# Altium footprint library OSHW_LuxonisMaster_20201223.PcbLib: 112 footprints (part 2 of 7)
Each footprint in its own frame and in the unit in brackets; x right, y up, seen from the top. Pads: shape width x height; smd on the part's side, far side on the other; paste and mask are expansions set on the pad; w line width, h text height; cw(c..) or ccw(c..) is an arc to the next point about the centre after c.
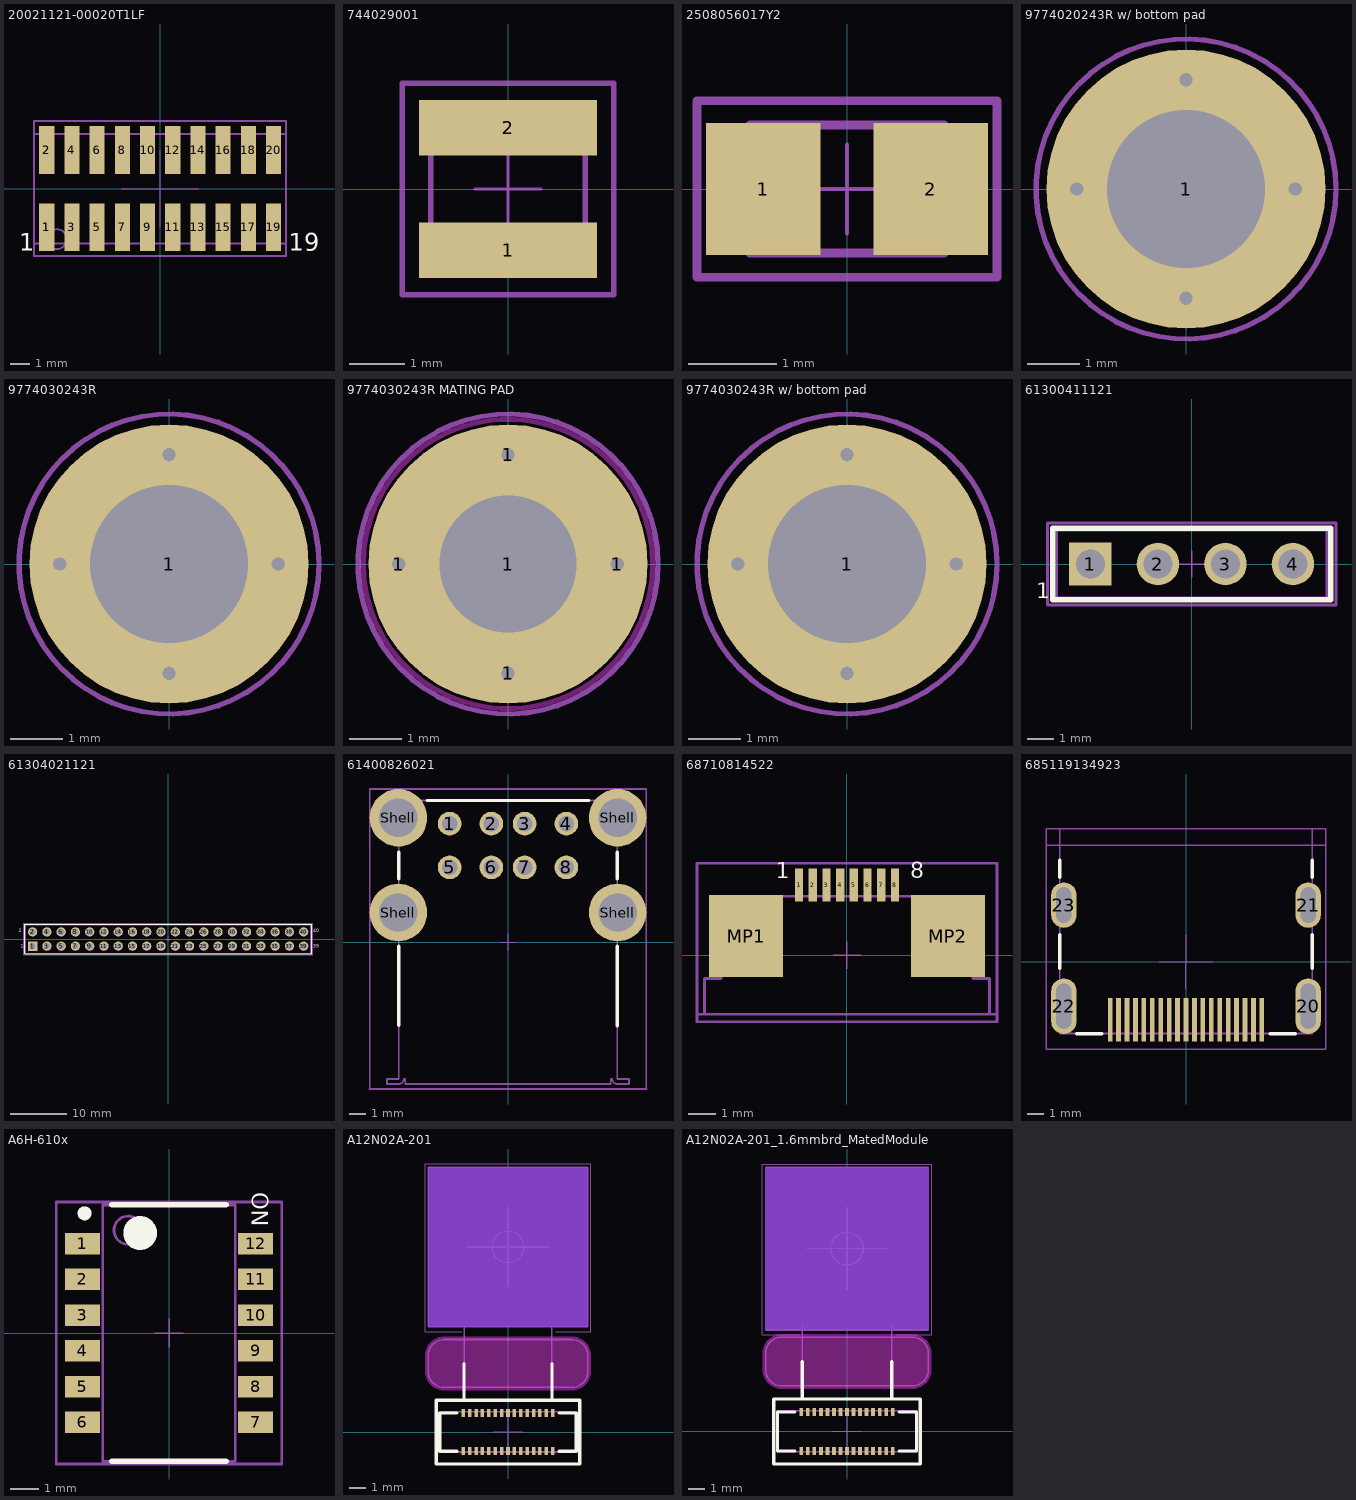
[diagram p1: the footprints below, top view; thin cyan lines are the x and y axes]

## 20021121-00020T1LF [mm] "20pin SMT Minitek127 1.27mm pitch"
pads (22):
  rect 0.76x2.4 smd: 1(-5.715,-1.95) 1(-5.715,-1.95) 2(-5.715,1.95) 2(-5.715,1.95) 3(-4.445,-1.95) 4(-4.445,1.95) 5(-3.175,-1.95) 6(-3.175,1.95) 7(-1.905,-1.95) 8(-1.905,1.95) 9(-0.635,-1.95) 10(-0.635,1.95) 11(0.635,-1.95) 12(0.635,1.95) 13(1.905,-1.95) 14(1.905,1.95) 15(3.175,-1.95) 16(3.175,1.95) 17(4.445,-1.95) 18(4.445,1.95) 19(5.715,-1.95) 20(5.715,1.95)
Top Overlay:
  text "1" at -7.112,-3.429 h1.52
  text "19" at 6.477,-3.429 h1.52
Top Assembly:
  lines w0.1: -6.35,-3.4 6.35,-3.4 6.35,3.4 -6.35,3.4 -6.35,-3.4 ; -4.699,-2.54 ccw(c-5.199,-2.54) -4.699,-2.54
  text "'.Designator'" at 0,0 h1
Top Courtyard:
  lines w0.05: -1.95,0 0.009,0 ; -0.009,0 1.95,0 ; 0,-1.95 0,0.009 ; 0,0 0,1.95 ; -6.35,-3.4 -6.35,3.4 6.35,3.4 6.35,-3.4 -6.35,-3.4
Top Component Outline:
  lines w0.1: -6.35,-2.75 -6.35,2.75 6.35,2.75 6.35,-2.75 -6.345,-2.75 -6.35,-2.75
3D body "20021121-00020T1LF.stp": height 4.55, standoff 0, extent -6.35,-2.75 6.35,2.75

## 744029001 [mm]
pads (2):
  rect 3.2x1 smd: 1(0,-1.1) 2(0,1.1)
Top Assembly:
  lines w0.1: -1.9,-1.9 -1.9,1.9 1.9,1.9 1.9,-1.9 -1.9,-1.9
  text "'.Designator'" at 0,0 h1
Top Courtyard:
  lines w0.05: -0.6,0 0,0 ; 0,-0.6 0,0 ; 0,0.6 0,0 ; 0.6,0 0,0 ; -1.9,-1.9 -1.9,1.9 1.9,1.9 1.9,-1.9 -1.9,-1.9
Top Component Outline:
  lines w0.1: -1.39,-1.39 1.39,-1.39 1.39,1.39 -1.39,1.39 -1.39,-1.39
3D body "STEP-WE-TPC-2813-rev1.stp": height 1.21, standoff 0.01, extent -1.39,-1.39 1.39,1.39

## 971110154 [mm] "Hex Standoff Threaded M2.5 Brass 0.433\" (11.00mm) Silver"
height 17
3D body "971110154_Download_STP_971110154_rev1.stp": height 17, standoff 0, extent -2.887,-2.5 2.887,2.5

## 2508056017Y2 [mm] "2508056017Y2 Chip Inductor, 2-Leads, Body 2.00x1.25mm"
height 1.1
pads (2):
  rect 1.3x1.5 smd: 1(-0.95,0) 2(0.95,0)
Top Assembly:
  lines w0.1: -1.7,-1 1.7,-1 1.7,1 -1.7,1 -1.7,-1
  text "'.Designator'" at 0.004,0 h1
Top Courtyard:
  lines w0.05: -0.5,0 0.5,0 ; 0,-0.5 0,0.5 ; -1.7,-1 -1.7,1 1.7,1 1.7,-1 -1.7,-1
Top Component Outline:
  lines w0.1: -1.1,-0.725 1.1,-0.725 1.1,0.725 -1.1,0.725 -1.1,-0.725
3D body: height 1.45, standoff 0, extent -0.596,-0.725 0.604,0.725
3D body: height 1.45, standoff 0, extent -1.096,-0.725 -0.596,0.725
3D body: height 1.45, standoff 0, extent 0.604,-0.725 1.104,0.725

## 9774020243R w/ bottom pad [mm] "STANDOFF_M2X0.4_2MM has bottom pad"
height 2
pads (1):
  round 5.3 / inner round 3 / far side round 5.3 hole 3 mask+0.05: 1(0,0)
via 0,2.075 diameter 0.508 hole 0.254
via 0,-2.075 diameter 0.508 hole 0.254
via -2.075,0 diameter 0.508 hole 0.254
via 2.075,0 diameter 0.508 hole 0.254
Top Paste:
  region: 0.317,2.581 0.278,1.576 0.397,1.55 0.628,1.471 0.845,1.359 1.042,1.214 1.214,1.042 1.359,0.845 1.471,0.628 1.55,0.397 1.576,0.278 2.581,0.317 2.554,0.531 2.432,0.946 2.242,1.334 1.991,1.686 1.686,1.991 1.334,2.242 0.946,2.432 0.531,2.554
  region: 2.581,-0.317 1.576,-0.278 1.55,-0.397 1.471,-0.628 1.359,-0.845 1.214,-1.042 1.042,-1.214 0.845,-1.359 0.628,-1.471 0.397,-1.55 0.278,-1.576 0.317,-2.581 0.531,-2.554 0.946,-2.432 1.334,-2.242 1.686,-1.991 1.991,-1.686 2.242,-1.334 2.432,-0.946 2.554,-0.531
  region: -0.317,-2.581 -0.278,-1.576 -0.397,-1.55 -0.628,-1.471 -0.845,-1.359 -1.042,-1.214 -1.214,-1.042 -1.359,-0.845 -1.471,-0.628 -1.55,-0.397 -1.576,-0.278 -2.581,-0.317 -2.554,-0.531 -2.432,-0.946 -2.242,-1.334 -1.991,-1.686 -1.686,-1.991 -1.334,-2.242 -0.946,-2.432 -0.531,-2.554
  region: -2.581,0.317 -1.576,0.278 -1.55,0.397 -1.471,0.628 -1.359,0.845 -1.214,1.042 -1.042,1.214 -0.845,1.359 -0.628,1.471 -0.397,1.55 -0.278,1.576 -0.317,2.581 -0.531,2.554 -0.946,2.432 -1.334,2.242 -1.686,1.991 -1.991,1.686 -2.242,1.334 -2.432,0.946 -2.554,0.531
Top Assembly:
  circle w0.1: c0,0 r2.85
  text "'.Designator'" at 0,0 h1
Top Courtyard:
  circle w0.05: c0,0 r2.85
  lines w0.05: -0.5,0 0.5,0 ; 0,-0.5 0,0.5
Bottom Courtyard:
  circle w0.05: c0,0 r2.85
Top Component Outline:
  circle w0.1: c0,0 r2.175
3D body "9774020243R_Download_STP_9774020243R_rev1.stp": height 2, standoff -1.4, extent -2.175,-2.172 2.175,2.172

## 9774030243R [mm] "STANDOFF_M2X0.4_3MM with no pad on bottom of PCB"
height 3
pads (1):
  round 5.3 / inner round 2.7 / far side round 2.7 hole 3 mask+0.05: 1(0,0)
via 2.075,0 diameter 0.508 hole 0.254
via -2.075,0 diameter 0.508 hole 0.254
via 0,-2.075 diameter 0.508 hole 0.254
via 0,2.075 diameter 0.508 hole 0.254
Top Paste:
  region: -2.581,0.317 -1.576,0.278 -1.55,0.397 -1.471,0.628 -1.359,0.845 -1.214,1.042 -1.042,1.214 -0.845,1.359 -0.628,1.471 -0.397,1.55 -0.278,1.576 -0.317,2.581 -0.531,2.554 -0.946,2.432 -1.334,2.242 -1.686,1.991 -1.991,1.686 -2.242,1.334 -2.432,0.946 -2.554,0.531
  region: -0.317,-2.581 -0.278,-1.576 -0.397,-1.55 -0.628,-1.471 -0.845,-1.359 -1.042,-1.214 -1.214,-1.042 -1.359,-0.845 -1.471,-0.628 -1.55,-0.397 -1.576,-0.278 -2.581,-0.317 -2.554,-0.531 -2.432,-0.946 -2.242,-1.334 -1.991,-1.686 -1.686,-1.991 -1.334,-2.242 -0.946,-2.432 -0.531,-2.554
  region: 2.581,-0.317 1.576,-0.278 1.55,-0.397 1.471,-0.628 1.359,-0.845 1.214,-1.042 1.042,-1.214 0.845,-1.359 0.628,-1.471 0.397,-1.55 0.278,-1.576 0.317,-2.581 0.531,-2.554 0.946,-2.432 1.334,-2.242 1.686,-1.991 1.991,-1.686 2.242,-1.334 2.432,-0.946 2.554,-0.531
  region: 0.317,2.581 0.278,1.576 0.397,1.55 0.628,1.471 0.845,1.359 1.042,1.214 1.214,1.042 1.359,0.845 1.471,0.628 1.55,0.397 1.576,0.278 2.581,0.317 2.554,0.531 2.432,0.946 2.242,1.334 1.991,1.686 1.686,1.991 1.334,2.242 0.946,2.432 0.531,2.554
Top Assembly:
  circle w0.1: c0,0 r2.85
  text "'.Designator'" at 0,0 h1
Top Courtyard:
  circle w0.05: c0,0 r2.85
  lines w0.05: -0.5,0 0.5,0 ; 0,-0.5 0,0.5
Bottom Courtyard:
  circle w0.05: c0,0 r2.85
Top Component Outline:
  circle w0.1: c0,0 r2.175
3D body "9774030243R (rev1).stp": height 3.05, standoff -1.35, extent -2.175,-2.172 2.175,2.172

## 9774030243R MATING PAD [mil] "Mating pad for 9774030243R Standoff"
height 118.11
pads (5):
  round 20 hole 10: 1(-81.69,0) 1(0,-81.69) 1(0,81.69) 1(81.69,0)
  round 208.66 / inner round 118.11 / far side round 208.66 hole 102.36 mask+1.97: 1(0,0)
Top Layer keep-out:
  circle w3.94: c0,0 r108.27
Top Assembly:
  circle w3.94: c0,0 r112.2
  text "'.Designator'" at 0,0 h39.37
Top Courtyard:
  circle w1.97: c0,0 r112.2
  lines w1.97: -19.68,0 19.68,0 ; 0,-19.68 0,19.68
Bottom Courtyard:
  circle w1.97: c0,0 r112.2

## 9774030243R w/ bottom pad [mm] "STANDOFF_M2X0.4_3MM has bottom pad"
height 3
pads (1):
  round 5.3 / inner round 3 / far side round 5.3 hole 3 mask+0.05: 1(0,0)
via 0,2.075 diameter 0.508 hole 0.254
via 0,-2.075 diameter 0.508 hole 0.254
via -2.075,0 diameter 0.508 hole 0.254
via 2.075,0 diameter 0.508 hole 0.254
Top Paste:
  region: 0.317,2.581 0.278,1.576 0.397,1.55 0.628,1.471 0.845,1.359 1.042,1.214 1.214,1.042 1.359,0.845 1.471,0.628 1.55,0.397 1.576,0.278 2.581,0.317 2.554,0.531 2.432,0.946 2.242,1.334 1.991,1.686 1.686,1.991 1.334,2.242 0.946,2.432 0.531,2.554
  region: 2.581,-0.317 1.576,-0.278 1.55,-0.397 1.471,-0.628 1.359,-0.845 1.214,-1.042 1.042,-1.214 0.845,-1.359 0.628,-1.471 0.397,-1.55 0.278,-1.576 0.317,-2.581 0.531,-2.554 0.946,-2.432 1.334,-2.242 1.686,-1.991 1.991,-1.686 2.242,-1.334 2.432,-0.946 2.554,-0.531
  region: -0.317,-2.581 -0.278,-1.576 -0.397,-1.55 -0.628,-1.471 -0.845,-1.359 -1.042,-1.214 -1.214,-1.042 -1.359,-0.845 -1.471,-0.628 -1.55,-0.397 -1.576,-0.278 -2.581,-0.317 -2.554,-0.531 -2.432,-0.946 -2.242,-1.334 -1.991,-1.686 -1.686,-1.991 -1.334,-2.242 -0.946,-2.432 -0.531,-2.554
  region: -2.581,0.317 -1.576,0.278 -1.55,0.397 -1.471,0.628 -1.359,0.845 -1.214,1.042 -1.042,1.214 -0.845,1.359 -0.628,1.471 -0.397,1.55 -0.278,1.576 -0.317,2.581 -0.531,2.554 -0.946,2.432 -1.334,2.242 -1.686,1.991 -1.991,1.686 -2.242,1.334 -2.432,0.946 -2.554,0.531
Top Assembly:
  circle w0.1: c0,0 r2.85
  text "'.Designator'" at 0,0 h1
Top Courtyard:
  circle w0.05: c0,0 r2.85
  lines w0.05: -0.5,0 0.5,0 ; 0,-0.5 0,0.5
Bottom Courtyard:
  circle w0.05: c0,0 r2.85
Top Component Outline:
  circle w0.1: c0,0 r2.175
3D body "9774030243R (rev1).stp": height 3.05, standoff -1.35, extent -2.175,-2.172 2.175,2.172

## 61300411121 [mm] "Pin Header, pitch 2.54 mm, THT, Vertical, single row, 4p"
height 8.54
pads (4):
  rect 1.6x1.6 hole 1.1: 1(-3.81,0)
  round 1.6 hole 1.1: 2(-1.27,0) 3(1.27,0) 4(3.81,0)
Top Overlay:
  lines w0.2: -5.23,-1.345 5.23,-1.345 5.23,1.345 -5.23,1.345 -5.23,-1.345
  text "1" at -5.86,-1.5 h1
Top Assembly:
  lines w0.1: -5.43,-1.545 5.43,-1.545 5.43,1.545 -5.43,1.545 -5.43,-1.545
  text "'.Designator'" at 0,0 h1
Top Courtyard:
  lines w0.05: -0.5,0 0.5,0 ; 0,-0.5 0,0.5 ; -5.43,-1.545 -5.43,1.545 5.43,1.545 5.43,-1.545 -5.43,-1.545
Top Component Outline:
  lines w0.1: -5.08,-1.27 -5.08,1.27 5.08,1.27 5.08,-1.27 -5.08,-1.27
3D body "61300411121.stp": height 8.57, standoff -2.97, extent -5.08,-1.27 5.08,1.27

## 61304021121 [mm] "Pin Header, pitch 2.54 mm, THT, Vertical, dual row, 40p"
height 8.54
pads (40):
  rect 1.65x1.65 hole 1.1: 1(-24.13,-1.27)
  round 1.65 hole 1.1: 2(-24.13,1.27) 3(-21.59,-1.27) 4(-21.59,1.27) 5(-19.05,-1.27) 6(-19.05,1.27) 7(-16.51,-1.27) 8(-16.51,1.27) 9(-13.97,-1.27) 10(-13.97,1.27) 11(-11.43,-1.27) 12(-11.43,1.27) 13(-8.89,-1.27) 14(-8.89,1.27) 15(-6.35,-1.27) 16(-6.35,1.27) 17(-3.81,-1.27) 18(-3.81,1.27) 19(-1.27,-1.27) 20(-1.27,1.27) 21(1.27,-1.27) 22(1.27,1.27) 23(3.81,-1.27) 24(3.81,1.27) 25(6.35,-1.27) 26(6.35,1.27) 27(8.89,-1.27) 28(8.89,1.27) 29(11.43,-1.27) 30(11.43,1.27) 31(13.97,-1.27) 32(13.97,1.27) 33(16.51,-1.27) 34(16.51,1.27) 35(19.05,-1.27) 36(19.05,1.27) 37(21.59,-1.27) 38(21.59,1.27) 39(24.13,-1.27) 40(24.13,1.27)
Top Overlay:
  lines w0.2: -25.55,-2.615 25.55,-2.615 25.55,2.615 -25.55,2.615 -25.55,-2.615
  text "2" at -26.56,0.9 h1
  text "1" at -26.26,-1.8 h1
  text "39" at 25.86,-1.8 h1
  text "40" at 25.86,0.9 h1
Top Assembly:
  lines w0.1: -25.75,-2.815 25.75,-2.815 25.75,2.815 -25.75,2.815 -25.75,-2.815
  text "'.Designator'" at 0,0 h1
Top Courtyard:
  lines w0.05: -0.5,0 0.5,0 ; 0,-0.5 0,0.5 ; -25.75,-2.815 -25.75,2.815 25.75,2.815 25.75,-2.815 -25.75,-2.815
Top Component Outline:
  lines w0.1: -25.4,-2.54 25.4,-2.54 25.4,2.54 -25.4,2.54 -25.4,-2.54
3D body "61304021121.stp": height 8.59, standoff -2.95, extent -25.4,-2.54 25.4,2.54

## 61400826021 [mm] "USB 2.0 Type A Horizontal Dual Stacked"
height 15.34
pads (12):
  round 1.42 hole 0.92: 1(-3.5,7.11) 2(-1,7.11) 3(1,7.11) 4(3.5,7.11) 5(-3.5,4.49) 6(-1,4.49) 7(1,4.49) 8(3.5,4.49)
  round 3.45 hole 2.3: Shell(-6.57,1.78) Shell(-6.57,7.46) Shell(6.57,1.78) Shell(6.57,7.46)
Top Overlay:
  lines w0.2: -6.55,-4.972 -6.55,-0.25 ; -6.55,3.81 -6.55,5.4 ; -4.85,8.5 4.85,8.5 ; 6.55,-5 6.55,-0.25 ; 6.55,3.81 6.55,5.4
Top Assembly:
  lines w0.1: 8.295,-8.8 -8.3,-8.8 -8.295,-8.8 -8.295,1.78 -8.295,7.46 -8.295,9.185 -6.57,9.185 6.57,9.185 8.295,9.185 8.295,7.46 8.295,1.78 8.295,-8.8 ; 8.295,-8.8 8.3,-8.8 8.295,-8.8
  text "'.Designator'" at 0,0 h1
Top Courtyard:
  lines w0.05: -0.5,0 0.5,0 ; 0,-0.5 0,0.5 ; 8.295,-8.8 -8.3,-8.8 -8.295,-8.8 -8.295,1.78 -8.295,7.46 -8.295,9.185 -6.57,9.185 6.57,9.185 8.295,9.185 8.295,7.46 8.295,1.78 8.295,-8.8 ; 8.295,-8.8 8.3,-8.8 8.295,-8.8
Top Component Outline:
  lines w0.1: -7.25,-8.5 -6.56,-8.5 ccw(c-6.55,-8.2) -6.25,-8.2 -6.15,-8.2 -6.15,-8.5 6.15,-8.5 6.15,-8.2 6.25,-8.2 ccw(c6.55,-8.2) 6.56,-8.5 7.25,-8.5 7.25,-8.2 6.55,-8.2 6.55,8.5 -6.55,8.5 -6.55,-8.2 -7.25,-8.2 -7.25,-8.5
3D body "61400826021.stp": height 15.93, standoff -3.91, extent -7.912,-8.5 7.912,8.65

## 68710814522 [mm] "ZIF Connectors, Horizontal, Bottom Contact, pitch 0.5mm, 8p"
height 2.25
pads (10):
  rect 0.3x1.2 smd: 1(-1.75,2.56) 2(-1.25,2.56) 3(-0.75,2.56) 4(-0.25,2.56) 5(0.25,2.56) 6(0.75,2.56) 7(1.25,2.56) 8(1.75,2.56)
  rect 2.7x3 smd: MP1(-3.68,0.7) MP2(3.68,0.7)
Top Overlay:
  text "8" at 2.3,2.61 h1
  text "1" at -2.6,2.61 h1
Top Assembly:
  lines w0.1: -5.475,-2.15 5.475,-2.15 ; -5.475,-2.425 -5.475,3.36 5.475,3.36 5.475,-2.425 -5.475,-2.425
  text "'.Designator'" at 0,0 h1
Top Courtyard:
  lines w0.05: -0.5,0 0.5,0 ; 0,-0.5 0,0.5 ; -5.475,-2.425 5.475,-2.425 5.475,3.36 -5.475,3.36 -5.475,-2.425
Top Component Outline:
  lines w0.1: -5.2,-2.15 -5.2,-0.85 -4.6,-0.85 -4.6,2.15 4.6,2.15 4.6,-0.85 5.2,-0.85 5.2,-2.15 -5.2,-2.15
3D body "68710814522.stp": height 2.1, standoff 0, extent -5.2,-2.15 5.2,2.95

## 685119134923 [mm] "HDMI  Receptacle Connector 19 Position Surface Mount, Right Angle; Through Hole"
height 6.13
pads (23):
  rect 0.28x2.6 smd mask+0.05: 1(-4.5,-3.45) 2(-4,-3.45) 3(-3.5,-3.45) 4(-3,-3.45) 5(-2.5,-3.45) 6(-2,-3.45) 7(-1.5,-3.45) 8(-1,-3.45) 9(-0.5,-3.45) 10(0,-3.45) 11(0.5,-3.45) 12(1,-3.45) 13(1.5,-3.45) 14(2,-3.45) 15(2.5,-3.45) 16(3,-3.45) 17(3.5,-3.45) 18(4,-3.45) 19(4.5,-3.45)
  oval 1.5x3.3 hole 0.9 slot 2.7 at 90 deg: 20(7.25,-2.65) 22(-7.25,-2.65)
  oval 1.5x2.7 hole 0.9 slot 2.1 at 90 deg: 21(7.25,3.35) 23(-7.25,3.35)
Top Overlay:
  lines w0.2: -7.5,-0.4 -7.5,1.6 ; -7.5,5 -7.5,6 ; -6.5,-4.275 -5,-4.275 ; 5,-4.275 6.5,-4.275 ; 7.5,-0.4 7.5,1.6 ; 7.5,5 7.5,6
Top Assembly:
  lines w0.1: -8.3,6.9 8.3,6.9 ; -8.3,-5.2 8.3,-5.2 8.3,7.875 -8.3,7.875 -8.3,-5.2
  text "'.Designator'" at 0,0 h1
Top Courtyard:
  lines w0.05: -1.6,0 0,0 ; -0.013,-1.6 -0.013,0 ; 0,1.6 0,0 ; 1.6,0 0,0 ; -8.3,-5.2 -8.3,7.875 8.3,7.875 8.3,-5.2 7.6,-5.2 -8.3,-5.2
Top Component Outline:
  lines w0.1: -7.5,-4.275 -7.5,7.875 7.5,7.875 7.5,-4.275 -7.5,-4.275
3D body "685119134923.stp": height 6.25, standoff -2.13, extent -7.5,-4.25 7.5,7.9

## A6H-610x [mm] "DIP Sw, Std/SealTape Body 8.85x4.50mm, Pitch 1.27mm, IPC High Density"
height 1.55
pads (12):
  rect 1.25x0.76 smd: 1(-3.075,3.175) 2(-3.075,1.905) 3(-3.075,0.635) 4(-3.075,-0.635) 5(-3.075,-1.905) 6(-3.075,-3.175) 7(3.075,-3.175) 8(3.075,-1.905) 9(3.075,-0.635) 10(3.075,0.635) 11(3.075,1.905) 12(3.075,3.175)
Top Overlay:
  circle w0.25: c-3,4.25 r0.125
  circle w0.6: c-1.025,3.55 r0.3
  lines w0.2: -2.025,-4.55 2.025,-4.55 ; -2.025,4.55 2.025,4.55
  text "ON" at 2.75,5 h1
Top Assembly:
  circle w0.1: c-1.45,3.65 r0.5
  lines w0.1: -4,-4.65 -4,4.65 4,4.65 4,-4.65 -4,-4.65
  text "'.Designator'" at 0,0 h1
Top Courtyard:
  lines w0.05: -0.5,0 0.5,0 ; 0,-0.5 0,0.5 ; -4,-4.65 -4,4.65 4,4.65 4,-4.65 -4,-4.65
Top Component Outline:
  lines w0.1: -2.35,-4.55 -2.35,4.55 2.35,4.55 2.35,-4.55 -2.35,-4.55
3D body "KAN1106Rx.stp": height 1.57, standoff 0, extent -3.35,-4.425 3.35,4.425

## A12N02A-201 [mm] "connector: 24-5804-030-000-829+"
pads (30):
  rect 0.22x0.5 smd mask+0.05: 1(-2.8,-1.2) 2(-2.4,-1.2) 3(-2,-1.2) 4(-1.6,-1.2) 5(-1.2,-1.2) 6(-0.8,-1.2) 7(-0.4,-1.2) 8(0,-1.2) 9(0.4,-1.2) 10(0.8,-1.2) 11(1.2,-1.2) 12(1.6,-1.2) 13(2,-1.2) 14(2.4,-1.2) 15(2.8,-1.2) 16(2.8,1.2) 17(2.4,1.2) 18(2,1.2) 19(1.6,1.2) 20(1.2,1.2) 21(0.8,1.2) 22(0.4,1.2) 23(0,1.2) 24(-0.4,1.2) 25(-0.8,1.2) 26(-1.2,1.2) 27(-1.6,1.2) 28(-2,1.2) 29(-2.4,1.2) 30(-2.8,1.2)
Bottom Layer keep-out:
  region: -4.999,16.599 4.999,16.599 4.999,6.601 -4.999,6.601
Top Overlay:
  lines w0.2: -3.2,-1.2 -4.275,-1.2 -4.275,1.2 -3.2,1.2 ; -2.75,2 -2.75,4.3 ; 2.75,2 2.75,4.3 ; 3.2,-1.2 4.275,-1.2 4.275,1.2 3.2,1.2 ; -4.5,-2 -4.5,2 4.5,2 4.5,-2 -4.5,-2
Bottom Overlay:
  lines w0.2: -2.75,4.3 -2.75,6.6 ; 2.75,4.3 2.75,6.6 ; -5,6.6 -5,16.6 5,16.6 5,6.6 -5,6.6
Keep-Out Layer:
  board cut-out: -5,4.8 -5,4.898 -4.962,5.092 -4.886,5.274 -4.777,5.437 -4.637,5.577 -4.474,5.686 -4.292,5.762 -4.098,5.8 -4,5.8 4,5.8 4.098,5.8 4.292,5.762 4.474,5.686 4.637,5.577 4.777,5.437 4.886,5.274 4.962,5.092 5,4.898 5,4.8 5,3.8 5,3.702 4.962,3.508 4.886,3.326 4.777,3.163 4.637,3.023 4.474,2.914 4.292,2.838 4.098,2.8 4,2.8 -4,2.8 -4.098,2.8 -4.292,2.838 -4.474,2.914 -4.637,3.023 -4.777,3.163 -4.886,3.326 -4.962,3.508 -5,3.702 -5,3.8
Keep-Out Layer:
  lines w0.2: -5.1,3.8 ccw(c-4,3.8) -4,2.7 0,2.7 4,2.7 ccw(c4,3.8) 5.1,3.8 5.1,4.8 ccw(c4,4.8) 4,5.9 -4,5.9 ccw(c-4,4.8) -5.1,4.8 -5.1,3.8
Board:
  lines w0.1: -5,3.8 ccw(c-4,3.8) -4,2.8 4,2.8 ccw(c4,3.8) 5,3.8 5,4.8 ccw(c4,4.8) 4,5.8 -4,5.8 ccw(c-4,4.8) -5,4.8 -5,3.8
Top Assembly:
  lines w0.1: -2.75,4.3 -2.75,2 ; 2.75,4.3 2.75,2 ; -2.75,2 -4.5,2 -4.5,-2 4.5,-2 4.5,2 2.75,2 ; -2.75,2 2.75,2
  text "'.Designator'" at 0,0.006 h1
Bottom Assembly:
  circle w0.1: c0,11.6 r1
  lines w0.1: -2.75,4.3 -2.75,6.6 ; -2.51,11.6 2.51,11.6 ; 0,9.1 0,14.1 ; 2.75,4.3 2.75,6.6 ; 2.51,11.6 2.51,11.6 ; 5,16.6 5,16.599 -4.999,16.599 -4.999,6.601 4.999,6.601 4.999,16.6 ; 4.999,16.6 5,16.6
Top Courtyard:
  lines w0.05: -2.75,4.3 -2.75,2 ; -0.91,0.006 0,0.006 ; 0,-0.904 0,0.006 ; 0,0.916 0,0.006 ; 0.91,0.006 0,0.006 ; 2.75,4.3 2.75,2 ; -2.75,2 2.75,2 ; -2.75,2 -4.5,2 -4.5,-2 4.5,-2 4.5,2 2.75,2
Bottom Courtyard:
  lines w0.05: -2.91,6.3 -5.2,6.3 -5.2,16.8 5.2,16.8 5.2,15.6 5.2,6.3 3,6.3
Top Component Outline:
  lines w0.1: -4.3,-1.25 -4.3,1.262 4.3,1.262 4.3,-1.25 -4.3,-1.25
Bottom Component Outline:
  lines w0.1: -4.999,6.601 -4.999,16.599 4.999,16.599 4.999,6.601 -4.999,6.601
3D body "K3D-WP7A-S030VA1-V2_JAE_Proprietary.STEP": height 0.65, standoff -0.03, extent -4.3,-1.25 4.3,1.262
3D body: height 6.18, standoff 0.25, extent -4.999,6.601 4.999,16.599

## A12N02A-201_1.6mmbrd_MatedModule [mm] "connector: 24-5804-030-000-829+ (1.4mm height w/ module mated)"
height 1.4
pads (30):
  rect 0.22x0.5 smd mask+0.05: 1(-2.8,-1.2) 2(-2.4,-1.2) 3(-2,-1.2) 4(-1.6,-1.2) 5(-1.2,-1.2) 6(-0.8,-1.2) 7(-0.4,-1.2) 8(0,-1.2) 9(0.4,-1.2) 10(0.8,-1.2) 11(1.2,-1.2) 12(1.6,-1.2) 13(2,-1.2) 14(2.4,-1.2) 15(2.8,-1.2) 16(2.8,1.2) 17(2.4,1.2) 18(2,1.2) 19(1.6,1.2) 20(1.2,1.2) 21(0.8,1.2) 22(0.4,1.2) 23(0,1.2) 24(-0.4,1.2) 25(-0.8,1.2) 26(-1.2,1.2) 27(-1.6,1.2) 28(-2,1.2) 29(-2.4,1.2) 30(-2.8,1.2)
Bottom Layer keep-out:
  region: -4.999,16.237 4.999,16.237 4.999,6.239 -4.999,6.239
Top Overlay:
  lines w0.2: -3.2,-1.2 -4.275,-1.2 -4.275,1.2 -3.2,1.2 ; -2.75,2 -2.75,4.3 ; 2.75,2 2.75,4.3 ; 3.2,-1.2 4.275,-1.2 4.275,1.2 3.2,1.2 ; -4.5,-2 -4.5,2 4.5,2 4.5,-2 -4.5,-2
Bottom Overlay:
  lines w0.2: -2.75,4.3 -2.75,6.6 ; 2.75,4.3 2.75,6.6 ; -5,6.238 -5,16.238 5,16.238 5,6.238 -5,6.238
Keep-Out Layer:
  board cut-out: -5,4.8 -5,4.898 -4.962,5.092 -4.886,5.274 -4.777,5.437 -4.637,5.577 -4.474,5.686 -4.292,5.762 -4.098,5.8 -4,5.8 4,5.8 4.098,5.8 4.292,5.762 4.474,5.686 4.637,5.577 4.777,5.437 4.886,5.274 4.962,5.092 5,4.898 5,4.8 5,3.8 5,3.702 4.962,3.508 4.886,3.326 4.777,3.163 4.637,3.023 4.474,2.914 4.292,2.838 4.098,2.8 4,2.8 -4,2.8 -4.098,2.8 -4.292,2.838 -4.474,2.914 -4.637,3.023 -4.777,3.163 -4.886,3.326 -4.962,3.508 -5,3.702 -5,3.8
Keep-Out Layer:
  lines w0.2: -5.1,3.8 ccw(c-4,3.8) -4,2.7 0,2.7 4,2.7 ccw(c4,3.8) 5.1,3.8 5.1,4.8 ccw(c4,4.8) 4,5.9 -4,5.9 ccw(c-4,4.8) -5.1,4.8 -5.1,3.8
Board:
  lines w0.1: -5,3.8 ccw(c-4,3.8) -4,2.8 4,2.8 ccw(c4,3.8) 5,3.8 5,4.8 ccw(c4,4.8) 4,5.8 -4,5.8 ccw(c-4,4.8) -5,4.8 -5,3.8
Top Assembly:
  lines w0.1: -2.75,4.3 -2.75,2 ; 2.75,4.3 2.75,2 ; -2.75,2 -4.5,2 -4.5,-2 4.5,-2 4.5,2 2.75,2 ; -2.75,2 2.75,2
  text "'.Designator'" at 0,0.006 h1
Bottom Assembly:
  circle w0.1: c0,11.238 r1
  lines w0.1: -2.75,4.3 -2.75,6.6 ; -2.51,11.238 2.51,11.238 ; 0,8.738 0,13.738 ; 2.75,4.3 2.75,6.6 ; 2.51,11.238 2.51,11.238 ; 5,16.238 5,16.237 -4.999,16.237 -4.999,6.239 4.999,6.239 4.999,16.238 ; 4.999,16.238 5,16.238
Top Courtyard:
  lines w0.05: -2.75,4.3 -2.75,2 ; -0.91,0.006 0,0.006 ; 0,-0.904 0,0.006 ; 0,0.916 0,0.006 ; 0.91,0.006 0,0.006 ; 2.75,4.3 2.75,2 ; -2.75,2 2.75,2 ; -2.75,2 -4.5,2 -4.5,-2 4.5,-2 4.5,2 2.75,2
Bottom Courtyard:
  lines w0.05: -2.91,5.938 -5.2,5.938 -5.2,16.438 5.2,16.438 5.2,15.238 5.2,5.938 3,5.938
Top Component Outline:
  lines w0.1: -4.3,-1.25 -4.3,1.262 4.3,1.262 4.3,-1.25 -4.3,-1.25
Bottom Component Outline:
  lines w0.1: -4.999,6.239 -4.999,16.237 4.999,16.237 4.999,6.239 -4.999,6.239
3D body "K3D-WP7A-S030VA1-V2_JAE_Proprietary.STEP": height 0.65, standoff -0.03, extent -4.3,-1.25 4.3,1.262
3D body: height 1.4, standoff 1, extent -4.5,-2 4.5,2
3D body: height 1.27, standoff 1.1, extent -2.75,2 2.75,4.3
3D body: height 6.18, standoff 0.25, extent -4.999,6.239 4.999,16.237
3D body: height 0.55, standoff 0.35, extent -2.75,4.3 2.75,6.6
3D body: height 3.29, standoff -3.29, extent -4.572,2.032 -4.572,2.032
3D body: height 3.29, standoff -3.29, extent -4.191,-5.715 -4.191,-5.715
3D body: height 3.29, standoff -3.29, extent -4.699,-4.191 -4.699,-4.191
3D body: height 3.29, standoff -3.29, extent -4.445,-2.032 -4.445,-2.032